# Altium footprint library iMX6 TinyRex Baseboard Lite_V1I1_PCB.PcbLib: 58 footprints (part 2 of 4)
Each footprint in its own frame and in the unit in brackets; x right, y up, seen from the top. Pads: shape width x height; smd on the part's side, far side on the other; paste and mask are expansions set on the pad; w line width, h text height; cw(c..) or ccw(c..) is an arc to the next point about the centre after c.
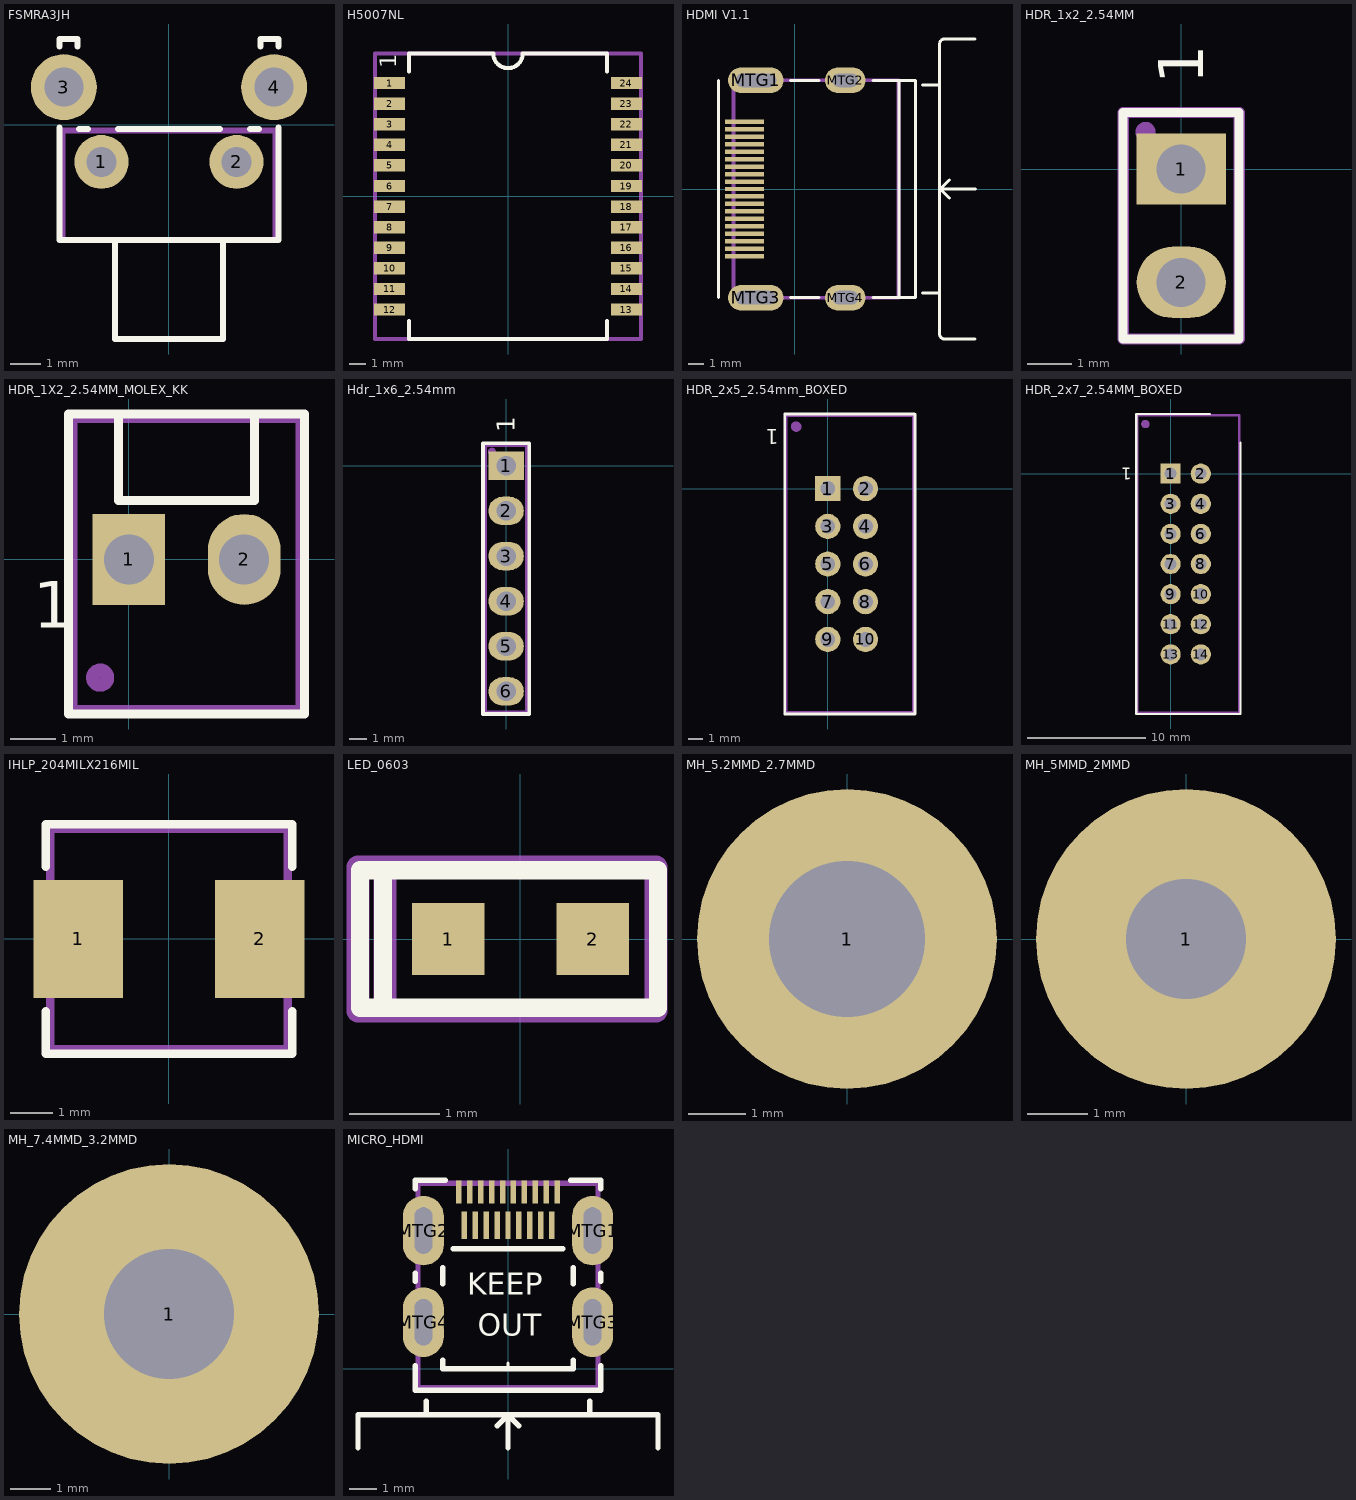
[diagram p1: the footprints below, top view; thin cyan lines are the x and y axes]

## FSMRA3JH [mm] "Creator MM"
height 7.01
pads (4):
  round 1.8 hole 1: 1(-2.25,-1.245) 2(2.25,-1.245)
  round 2.2 hole 1.3: 3(-3.505,1.245) 4(3.505,1.245)
Top Overlay:
  lines w0.2: -3.65,-0.1 -3.65,-3.845 3.65,-3.845 3.65,-0.1 ; -3.65,2.6 -3.65,2.85 -3.055,2.85 -3.055,2.6 ; -3,-0.145 -2.7,-0.145 ; -1.8,-3.845 -1.8,-7.145 1.8,-7.145 1.8,-3.845 ; -1.7,-0.145 1.7,-0.145 ; 2.7,-0.145 3,-0.145 ; 3.055,2.6 3.055,2.85 3.65,2.85 3.65,2.6
Mechanical 16:
  lines w0.2: -3.55,-3.845 -3.55,-0.2 3.55,-0.2 3.55,-3.845 1.8,-3.845 1.8,-7.145 -1.8,-7.145 -1.8,-3.845 -3.55,-3.845
Mechanical 29:
  text ".Designator" at 1.6,-1.4 h1.2
3D body "c-1825027-8-g1-3d.stp": height 7.05, standoff -3.47, extent -4.204,-7.101 4.204,2.741

## H5007NL [mil]
pads (24):
  rect 75x30 smd: 1(-287.5,275) 2(-287.5,225) 3(-287.5,175) 4(-287.5,125) 5(-287.5,75) 6(-287.5,25) 7(-287.5,-25) 8(-287.5,-75) 9(-287.5,-125) 10(-287.5,-175) 11(-287.5,-225) 12(-287.5,-275) 13(287.5,-275) 14(287.5,-225) 15(287.5,-175) 16(287.5,-125) 17(287.5,-75) 18(287.5,-25) 19(287.5,25) 20(287.5,75) 21(287.5,125) 22(287.5,175) 23(287.5,225) 24(287.5,275)
Top Overlay:
  lines w10: -240.16,-303.15 -240.16,-346.46 240.16,-346.46 240.16,-303.15 ; -240.16,303.15 -240.16,346.46 -37.66,346.46 ; -35.43,346.46 ccw(c0.01,346.46) 35.45,346.46 ; 37.66,346.46 240.16,346.46 240.16,303.15
  text "1" at -271.65,311.02 h40
Mechanical 16:
  circle w10: c-287.4,275.59 r3.94
  lines w10: -322.83,-346.46 -322.83,346.46 322.83,346.46 322.83,-346.46 -322.83,-346.46
Mechanical 29:
  text ".Designator" at 55.12,27.56 h60
3D body: height 216.93, standoff 0, extent -240.16,-346.46 240.16,346.46

## HDMI V1.1 [mm] "Changed holes to slots"
pads (23):
  rect 2.6x0.3 smd mask+0.025: 1(-3.36,4.5) 2(-3.36,4) 3(-3.36,3.5) 4(-3.36,3) 5(-3.36,2.5) 6(-3.36,2) 7(-3.36,1.5) 8(-3.36,1) 9(-3.36,0.5) 10(-3.36,0) 11(-3.36,-0.5) 12(-3.36,-1) 13(-3.36,-1.5) 14(-3.36,-2) 15(-3.36,-2.5) 16(-3.36,-3) 17(-3.36,-3.5) 18(-3.36,-4) 19(-3.36,-4.5)
  oval 3.7x1.7 hole 0.9 slot 2.7 at 0 deg: MTG1(-2.6,7.25) MTG3(-2.6,-7.25)
  oval 2.7x1.7 hole 0.9 slot 1.7 at 0 deg: MTG2(3.36,7.25) MTG4(3.36,-7.25)
Top Overlay:
  lines w0.2: -5.1,-7.25 -5.1,7.25 ; -0.3,-7.25 1.6,-7.25 ; -0.3,7.25 1.6,7.25 ; 5.2,-7.25 8.05,-7.25 8.05,7.25 5.2,7.25 ; 6.95,-7.2 6.95,7.25 ; 8.5,-6.95 9.65,-6.95 ; 8.5,6.95 9.65,6.95 ; 9.95,10 12,10 ; 10,10 ccw(c9.975,9.675) 9.65,9.7 9.65,-9.7 ccw(c9.975,-9.675) 10,-10 12,-10 ; 10.3,-0.6 9.7,0 ; 10.3,0.6 9.7,0 ; 12.05,0 9.7,0
Mechanical 1:
  text "NOTE: Bottom plastic may" at -4.4,10.8 h0.5
  text "go over the board edge" at -4.4,9.6 h0.5
Mechanical 16:
  lines w0.254: -4.1,-7.25 -4.1,7.25 6.9,7.25 6.9,-7.25 -4.1,-7.25
Mechanical 29:
  text ".Designator" at -0.67,-0.46 h1.52
3D body "471510001.stp": height 6.28, standoff -2.1, extent -4.2,-7.5 7.95,7.5

## HDR_1x2_2.54MM [mm]
pads (2):
  rect 2x1.6 hole 1.1: 1(0,0)
  oval 2x1.6 hole 1.1: 2(0,-2.54)
Top Overlay:
  lines w0.2: -1.3,-3.81 1.3,-3.81 1.3,1.27 -1.3,1.27 -1.3,-3.81
  text "1" at 0.5,1.9 h1.02
Mechanical 16:
  circle w0.254: c-0.8,0.83 r0.1
  lines w0.254: -1.3,-3.81 -1.3,1.27 1.3,1.27 1.3,-3.81 -1.3,-3.81
Mechanical 29:
  text ".Designator" at 0.5,-2.5 h1
3D body "77311-118-02lf.stp": height 8.4, standoff -3.1, extent -1.205,-3.62 1.205,1.06

## HDR_1X2_2.54MM_MOLEX_KK [mm] "Creator MM"
pads (2):
  rect 1.6x2 hole 1.1: 1(0,0)
  oval 1.6x2 hole 1.1: 2(2.54,0)
Top Overlay:
  lines w0.2: -0.23,3.2 -0.23,1.3 2.77,1.3 2.77,3.2 ; -1.33,-3.4 3.87,-3.4 3.87,3.2 -1.33,3.2 -1.33,-3.4
  text "1" at -2.1,-1.5 h1.02
Mechanical 16:
  circle w0.3: c-0.63,-2.6 r0.16
  lines w0.2: -1.23,-3.3 -1.23,3.1 3.77,3.1 3.77,-3.3 -1.23,-3.3
Mechanical 29:
  text ".Designator" at 0,-1 h1.5
3D body "022112022.stp": height 10.69, standoff -3.53, extent -1.194,-3.275 3.734,3.075

## Hdr_1x6_2.54mm [mm] "Creator MM"
pads (6):
  rect 2x1.6 hole 1.1: 1(0,0)
  oval 2x1.6 hole 1.1: 2(0,-2.54) 3(0,-5.08) 4(0,-7.62) 5(0,-10.16) 6(0,-12.7)
Top Overlay:
  lines w0.2: -1.3,-13.97 1.3,-13.97 1.3,1.27 -1.3,1.27 -1.3,-13.97
  text "1" at 0.5,1.9 h1.02
Mechanical 16:
  circle w0.254: c-0.8,0.79 r0.1
  lines w0.254: -1.2,-13.89 1.2,-13.89 1.2,1.19 -1.2,1.19 -1.2,-13.89
Mechanical 29:
  text ".Designator" at 0.7,-8.5 h1.52
3D body "77311-y18-06_asm.stp": height 8.4, standoff -3.1, extent -1.205,-13.77 1.205,1.07

## HDR_2x5_2.54mm_BOXED [mm] "Creator MM"
height 9.91
pads (10):
  rect 1.7x1.7 hole 1: 1(0,0)
  round 1.7 hole 1: 2(2.54,0) 3(0,-2.54) 4(2.54,-2.54) 5(0,-5.08) 6(2.54,-5.08) 7(0,-7.62) 8(2.54,-7.62) 9(0,-10.16) 10(2.54,-10.16)
Top Overlay:
  lines w0.2: -2.9,-15.19 5.89,-15.19 5.89,5 5.86,5.03 -2.9,5.03 -2.9,-15.19
  text "1" at -3.3,4 h1.02
Mechanical 16:
  circle w0.5: c-2.13,4.18 r0.1
  lines w0.2: -2.8,-15.09 5.79,-15.09 5.79,4.93 -2.8,4.93 -2.8,-15.09
Mechanical 29:
  text ".Designator" at 0.5,-3.2 h1.52
3D body "30310-6002.stp": height 8.89, standoff -3.17, extent -2.906,-15.22 5.908,5.075

## HDR_2x7_2.54MM_BOXED [mm] "Creator MM"
height 9.91
pads (14):
  rect 1.7x1.7 hole 1: 1(0,0)
  round 1.7 hole 1: 2(2.54,0) 3(0,-2.54) 4(2.54,-2.54) 5(0,-5.08) 6(2.54,-5.08) 7(0,-7.62) 8(2.54,-7.62) 9(0,-10.16) 10(2.54,-10.16) 11(0,-12.7) 12(2.54,-12.7) 13(0,-15.24) 14(2.54,-15.24)
Top Overlay:
  lines w0.2: 3.3,5.03 -2.9,5.03 -2.9,-20.27 5.89,-20.27 5.89,2.61
  text "1" at -3.3,0.5 h1.02
Mechanical 16:
  circle w0.5: c-2.13,4.18 r0.1
  lines w0.2: -2.8,-20.17 5.79,-20.17 5.79,4.93 -2.8,4.93 -2.8,-20.17
Mechanical 29:
  text ".Designator" at 0.5,-5.7 h1.52
3D body "30314-6002.stp": height 8.89, standoff -3.17, extent -2.91,-20.312 5.904,5.062

## IHLP_204MILX216MIL [mm] "Creator MM"
pads (2):
  rect 2.115x2.79 smd: 1(-2.137,0) 2(2.138,0)
Top Overlay:
  lines w0.2: -2.9,-1.7 -2.9,-2.7 2.9,-2.7 2.9,-1.7 ; -2.9,1.7 -2.9,2.7 2.9,2.7 2.9,1.7
Mechanical 16:
  lines w0.2: -2.8,-2.6 -2.8,2.6 2.8,2.6 2.8,-2.6 -2.8,-2.6
Mechanical 29:
  text ".Designator" at -0.9,-0.6 h1.52
3D body: height 3, standoff 0, extent -2.75,-2.6 2.75,2.6

## iMX6 TinyRex Module 3D [mm] "For 1.5mm standoff mating. .Creator MM"
3D body "3D Model - iMX6 TinyRex V1I1 - Prototype.step": height 5.05, standoff 0.11, extent 0,0 38,38

## LED_0603 [mm]
pads (2):
  rect 0.8x0.8 smd: 1(-0.8,0) 2(0.8,0)
Top Overlay:
  lines w0.2: -1.524,-0.762 -1.524,0.762 ; -1.778,-0.762 -1.778,0.762 1.524,0.762 1.524,-0.762 -1.778,-0.762
Mechanical 16:
  lines w0.254: -1.5,-0.8 -1.5,0.8 ; -1.8,-0.8 1.5,-0.8 1.5,0.8 -1.8,0.8 -1.8,-0.8
Mechanical 29:
  text ".Designator" at 0.5,0.3 h0.6
3D body: height 0.66, standoff 0.5, extent -0.2,-0.2 0.2,0.2
3D body "LED SMD 0603.step": height 0.65, standoff 0, extent -0.85,-0.4 0.85,0.4

## MH_5.2MMD_2.7MMD [mm] "Creator MM"
pads (1):
  round 5.2 / inner round 3.683 / far side round 5.2 hole 2.7: 1(0,0)

## MH_5MMD_2MMD [mm]
pads (1):
  round 5 / inner round 3.683 / far side round 5 hole 2: 1(0,0)

## MH_7.4MMD_3.2MMD [mm]
pads (1):
  round 7.4 / inner round 3.683 / far side round 7.4 hole 3.2 mask+0.025: 1(0,0)

## MICRO_HDMI [mm] "Creator MM"
pads (23):
  rect 0.2x0.85 smd mask+0.03: 1(1.8,6.475) 3(1.4,6.475) 5(1,6.475) 7(0.6,6.475) 9(0.2,6.475) 11(-0.2,6.475) 13(-0.6,6.475) 15(-1,6.475) 17(-1.4,6.475) 19(-1.8,6.475)
  rect 0.2x1 smd mask+0.03: 2(1.6,5.25) 4(1.2,5.25) 6(0.8,5.25) 8(0.4,5.25) 10(0,5.25) 12(-0.4,5.25) 14(-0.8,5.25) 16(-1.2,5.25) 18(-1.6,5.25)
  oval 1.5x2.55 hole 0.65 slot 1.7 at 90 deg: MTG1(3.1,5.06) MTG2(-3.1,5.06) MTG3(3.1,1.7) MTG4(-3.1,1.7)
Top Overlay:
  lines w0.1: 0,0 0,0.2
  lines w0.2: -5.5,-2.9 -5.5,-1.7 5.5,-1.7 5.5,-2.9 ; -3.4,0.1 -3.4,-0.8 3.4,-0.8 3.4,0.1 ; -3.4,3.2 -3.4,3.5 ; -3.4,6.6 -3.4,6.9 -2.3,6.9 ; -3,-1.7 -3,-1.2 ; -2.4,0.3 -2.4,0 2.4,0 2.4,0.3 ; -2.4,3.1 -2.4,3.7 ; -2,4.4 2,4.4 ; -0.4,-2.1 0,-1.7 ; 0,-2.9 0,-1.7 ; 0.4,-2.1 0,-1.7 ; 2.3,6.9 3.4,6.9 3.4,6.6 ; 2.4,3.1 2.4,3.7 ; 3,-1.7 3,-1.2 ; 3.4,3.2 3.4,3.5
  text "KEEP" at -1.5,2.7 h0.8
  text "OUT" at -1.1,1.2 h0.8
Mechanical 16:
  lines w0.2: -3.3,-0.7 3.3,-0.7 3.3,6.8 -3.3,6.8 -3.3,-0.7
Mechanical 29:
  text ".Designator" at 1.5,4 h1.5
3D body "467651301.stp": height 2.97, standoff -0.55, extent -3.25,-0.7 3.25,6.8

## Micro_SD_card [mm] ".Creator MM"
3D body "Micro_SD_Card.step": height 1.83, standoff 0.85, extent -8.65,-13.74 2.35,1.26